# Altium footprint library Miscellaneous THD.PcbLib: 216 footprints (part 10 of 15)
Each footprint in its own frame and in the unit in brackets; x right, y up, seen from the top. Pads: shape width x height; smd on the part's side, far side on the other; paste and mask are expansions set on the pad; w line width, h text height; cw(c..) or ccw(c..) is an arc to the next point about the centre after c.
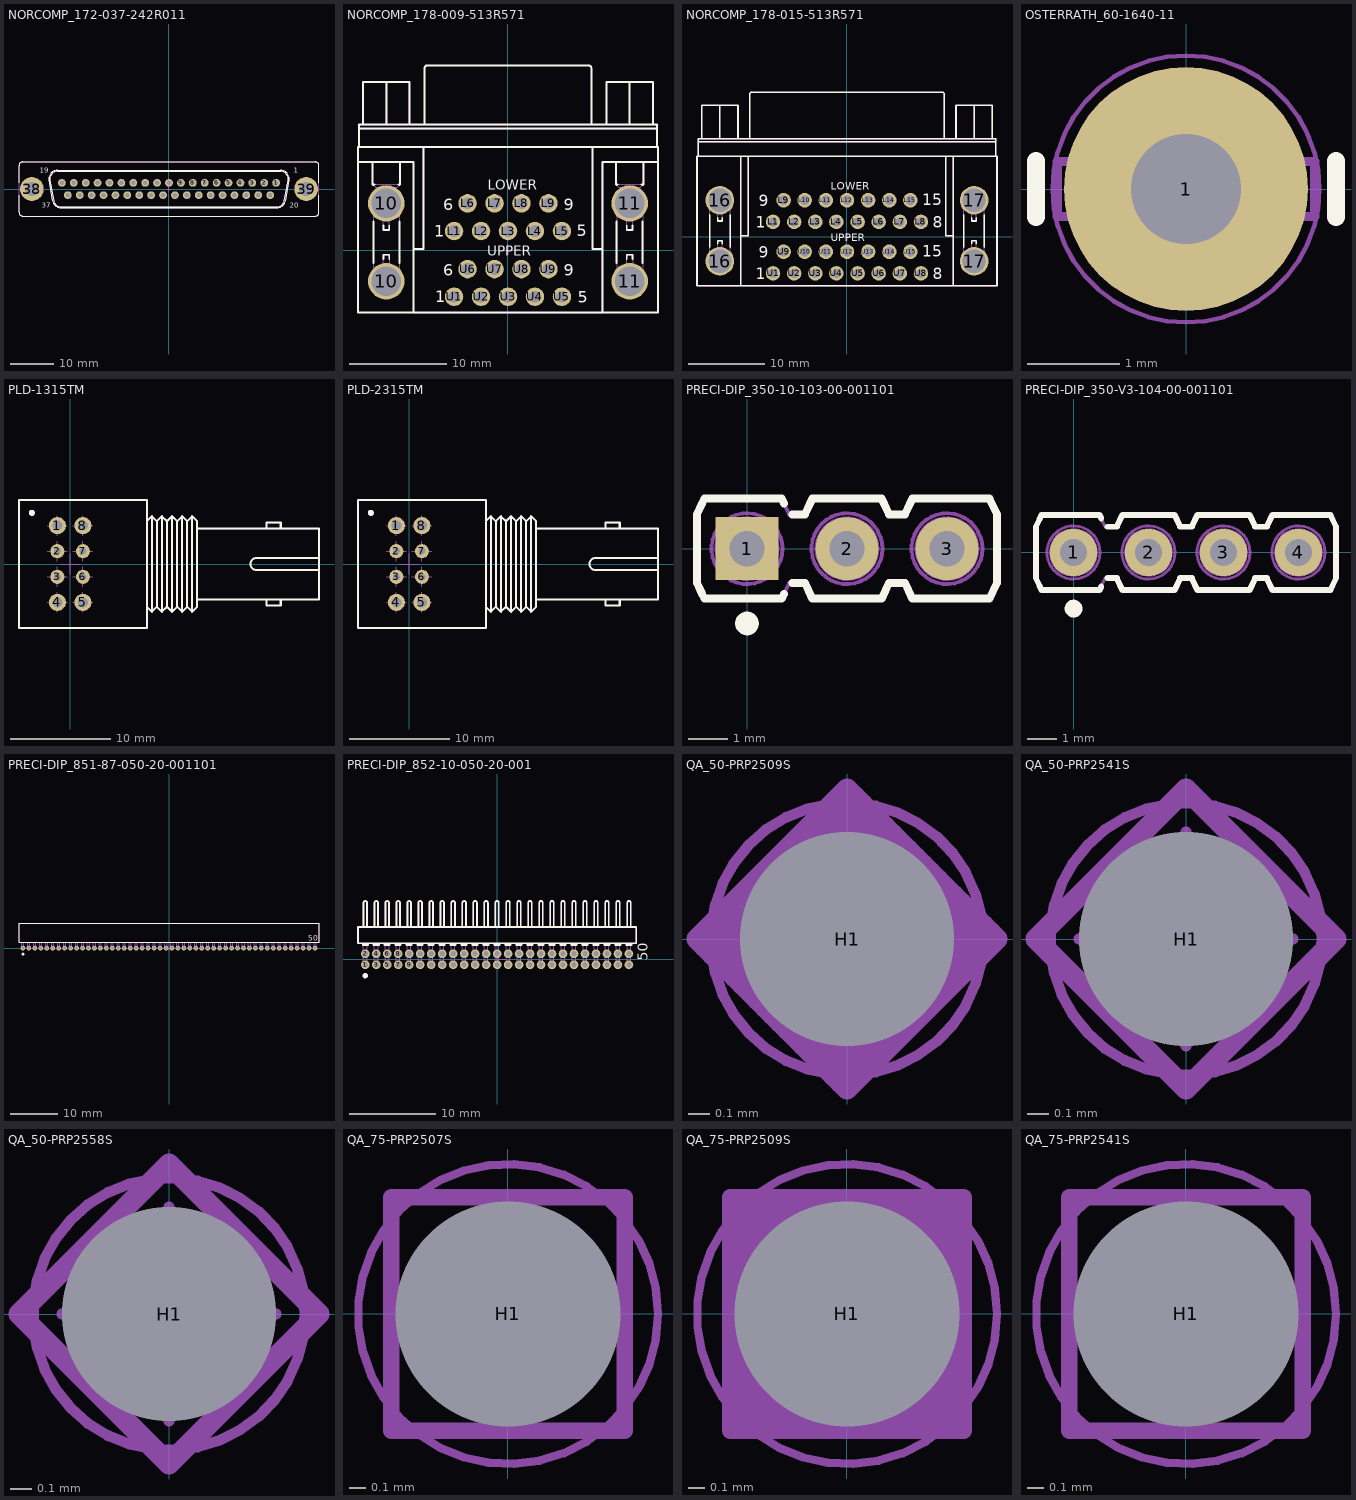
[diagram p9: the footprints below, top view; thin cyan lines are the x and y axes]

## NORCOMP_172-037-242R011 [mm] "Straight Wire Wrap D-Sub 37 Contacts Female Connector"
height 12.08
pads (39):
  round 1.8 hole 1.1: 1(24.842,1.422) 2(22.082,1.422) 3(19.322,1.422) 4(16.561,1.422) 5(13.801,1.422) 6(11.041,1.422) 7(8.281,1.422) 8(5.52,1.422) 9(2.76,1.422) 10(0,1.422) 11(-2.76,1.422) 12(-5.52,1.422) 13(-8.281,1.422) 14(-11.041,1.422) 15(-13.801,1.422) 16(-16.561,1.422) 17(-19.322,1.422) 18(-22.082,1.422) 19(-24.842,1.422) 20(23.458,-1.422) 21(20.697,-1.422) 22(17.937,-1.422) 23(15.177,-1.422) 24(12.417,-1.422) 25(9.657,-1.422) 26(6.896,-1.422) 27(4.136,-1.422) 28(1.376,-1.422) 29(-1.384,-1.422) 30(-4.145,-1.422) 31(-6.905,-1.422) 32(-9.665,-1.422) 33(-12.425,-1.422) 34(-15.185,-1.422) 35(-17.946,-1.422) 36(-20.706,-1.422) 37(-23.466,-1.422)
  round 5.5 hole 3.2: 38(-31.8,0) 39(31.801,0)
Top Overlay:
  lines w0.2: -34.785,-1.5 -34.785,-5.41 ccw(c-33.896,-5.41) -33.896,-6.299 33.897,-6.299 ccw(c33.897,-5.41) 34.786,-5.41 34.786,-1.5 ; -34.785,1.5 -34.785,5.41 cw(c-33.896,5.41) -33.896,6.299 33.897,6.299 cw(c33.897,5.41) 34.786,5.41 34.786,1.5 ; -27.858,2.035 cw(c-25.932,2.375) -25.932,4.331 25.933,4.331 cw(c25.933,2.375) 27.859,2.035 27.021,-2.715 cw(c25.095,-2.375) 25.095,-4.331 -25.094,-4.331 cw(c-25.094,-2.375) -27.02,-2.715 -27.858,2.035 ; -27.608,2.079 cw(c-25.932,2.375) -25.932,4.077 25.933,4.077 cw(c25.933,2.375) 27.609,2.079 26.77,-2.671 cw(c25.095,-2.375) 25.095,-4.077 -25.094,-4.077 cw(c-25.094,-2.375) -26.769,-2.671 -27.608,2.079
  text "20" at 28.031,-4.4 h1.2
  text "19" at -30.031,3.8 h1.2
  text "37" at -29.531,-4.4 h1.2
  text "1" at 28.881,3.8 h1.2
Mechanical 8:
  drawing of 160 lines, arcs and shapes, not listed
Mechanical 14:
  circle w0.1: c31.801,0 r2
  circle w0.1: c31.801,0 r1.524
  circle w0.1: c-31.8,0 r2
  circle w0.1: c-31.8,0 r1.524
  circle w0.1: c16.561,1.422 r0.61
  circle w0.1: c15.177,-1.422 r0.61
  circle w0.1: c13.801,1.422 r0.61
  circle w0.1: c11.041,1.422 r0.61
  circle w0.1: c12.417,-1.422 r0.61
  circle w0.1: c9.657,-1.422 r0.61
  circle w0.1: c8.281,1.422 r0.61
  circle w0.1: c6.896,-1.422 r0.61
  circle w0.1: c5.52,1.422 r0.61
  circle w0.1: c4.136,-1.422 r0.61
  circle w0.1: c2.76,1.422 r0.61
  circle w0.1: c0,1.422 r0.61
  circle w0.1: c1.376,-1.422 r0.61
  circle w0.1: c-1.384,-1.422 r0.61
  circle w0.1: c-2.76,1.422 r0.61
  circle w0.1: c-4.145,-1.422 r0.61
  circle w0.1: c-5.52,1.422 r0.61
  circle w0.1: c-6.905,-1.422 r0.61
  circle w0.1: c-8.281,1.422 r0.61
  circle w0.1: c-9.665,-1.422 r0.61
  circle w0.1: c-11.041,1.422 r0.61
  circle w0.1: c-12.425,-1.422 r0.61
  circle w0.1: c-13.801,1.422 r0.61
  circle w0.1: c-15.185,-1.422 r0.61
  circle w0.1: c-16.561,1.422 r0.61
  circle w0.1: c-24.842,1.422 r0.61
  circle w0.1: c-23.466,-1.422 r0.61
  circle w0.1: c-22.082,1.422 r0.61
  circle w0.1: c-20.706,-1.422 r0.61
  circle w0.1: c-19.322,1.422 r0.61
  circle w0.1: c-17.946,-1.422 r0.61
  circle w0.1: c17.937,-1.422 r0.61
  circle w0.1: c20.697,-1.422 r0.61
  circle w0.1: c19.322,1.422 r0.61
  circle w0.1: c22.082,1.422 r0.61
  circle w0.1: c23.458,-1.422 r0.61
  circle w0.1: c24.842,1.422 r0.61
  lines w0.1: -34.785,-5.41 ccw(c-33.896,-5.41) -33.896,-6.299 33.897,-6.299 ccw(c33.897,-5.41) 34.786,-5.41 34.786,5.41 ccw(c33.897,5.41) 33.897,6.299 -33.896,6.299 ccw(c-33.896,5.41) -34.785,5.41 -34.785,-5.41 ; -27.858,2.035 cw(c-25.932,2.375) -25.932,4.331 25.933,4.331 cw(c25.933,2.375) 27.859,2.035 27.021,-2.715 cw(c25.095,-2.375) 25.095,-4.331 -25.094,-4.331 cw(c-25.094,-2.375) -27.02,-2.715 -27.858,2.035 ; -27.608,2.079 cw(c-25.932,2.375) -25.932,4.077 25.933,4.077 cw(c25.933,2.375) 27.609,2.079 26.77,-2.671 cw(c25.095,-2.375) 25.095,-4.077 -25.094,-4.077 cw(c-25.094,-2.375) -26.769,-2.671 -27.608,2.079
  text "1" at 28.881,3.8 h1.2
  text "37" at -29.531,-4.4 h1.2
  text "19" at -30.031,3.8 h1.2
  text "20" at 28.031,-4.4 h1.2
3D body "NORCOMP_172-037-242R011.stp": height 11.93, standoff -12.7, extent -34.785,-6.299 34.786,6.299

## NORCOMP_178-009-513R571 [mm] "Dual Stacked  Right Angled D-SUB 9 Pins Female Connector, With Threaded Insert UNC 4-40, And Fork Board Lock"
height 31.75
pads (22):
  round 3.75 hole 3.05: 10(-12.495,-3.205) 10(-12.495,4.795) 11(12.495,-3.205) 11(12.495,4.795)
  round 1.9 hole 1.2: L1(-5.54,1.955) L2(-2.77,1.955) L3(0,1.955) L4(2.77,1.955) L5(5.54,1.955) L6(-4.155,4.795) L7(-1.385,4.795) L8(1.385,4.795) L9(4.155,4.795) U1(-5.54,-4.795) U2(-2.77,-4.795) U3(0,-4.795) U4(2.77,-4.795) U5(5.54,-4.795) U6(-4.155,-1.955) U7(-1.385,-1.955) U8(1.385,-1.955) U9(4.155,-1.955)
Top Overlay:
  lines w0.2: -15.405,9.039 -9.69,9.039 -9.69,-6.43 9.69,-6.43 9.69,9.039 15.405,9.039 ; -14.872,12.874 -14.872,17.274 -10.122,17.274 -10.122,12.874 ; -13.897,9.039 -13.897,6.739 ; -13.828,-1.331 -13.828,2.919 ; -13.828,6.669 -13.897,6.739 ; -13.725,6.739 -13.897,6.739 ; -12.797,-0.924 -12.797,-0.483 -12.197,-0.483 -12.197,-0.925 ; -12.797,2.513 -12.797,2.075 -12.197,2.075 -12.197,2.514 ; -12.497,12.875 -12.497,17.274 ; -11.265,6.739 -11.097,6.739 ; -11.164,6.671 -11.097,6.739 ; -11.158,-1.333 -11.158,2.924 ; -11.097,9.039 -11.097,6.739 ; -9.69,-6.405 -15.405,-6.405 -15.405,10.563 15.405,10.563 15.405,-6.405 9.69,-6.405 ; -9.69,0.123 -8.699,0.123 -8.699,10.563 ; -8.569,12.874 -8.569,18.67 cw(c-8.269,18.67) -8.269,18.97 8.269,18.97 cw(c8.269,18.67) 8.569,18.67 8.569,12.874 ; 8.7,10.563 8.7,0.123 9.69,0.123 ; 10.122,12.874 10.122,17.274 14.872,17.274 14.872,12.874 ; 11.097,9.039 11.097,6.739 ; 11.162,-1.331 11.162,2.919 ; 11.164,6.671 11.097,6.739 ; 11.265,6.739 11.097,6.739 ; 12.193,-0.924 12.193,-0.483 12.793,-0.483 12.793,-0.925 ; 12.193,2.513 12.193,2.075 12.793,2.075 12.793,2.514 ; 12.497,12.875 12.497,17.274 ; 13.725,6.739 13.897,6.739 ; 13.828,6.669 13.897,6.739 ; 13.832,-1.333 13.832,2.924 ; 13.897,9.039 13.897,6.739 ; -15.291,10.588 -15.291,12.468 15.291,12.468 15.291,10.588 -15.291,10.588 ; -15.291,12.493 -15.291,12.874 15.291,12.874 15.291,12.493 -15.291,12.493
  text "5" at 7.141,-5.407 h1.2
  text "9" at 5.726,-2.642 h1.2
  text "6" at -6.661,-2.642 h1.2
  text "1" at -7.474,-5.382 h1.2
  text "UPPER" at -2.125,-0.6 h1
  text "6" at -6.661,4.108 h1.2
  text "1" at -7.549,1.368 h1.2
  text "LOWER" at -2.1,6.18 h1
  text "5" at 7.041,1.393 h1.2
  text "9" at 5.726,4.108 h1.2
Mechanical 8:
  lines w0.1: -15.405,12.875 0,12.875 15.405,12.875 ; -12.995,-3.205 -12.495,-3.205 ; -12.995,4.795 -12.495,4.795 ; -12.495,-3.705 -12.495,-3.205 ; -12.495,-2.705 -12.495,-3.205 ; -12.495,4.295 -12.495,4.795 ; -12.495,5.295 -12.495,4.795 ; -11.995,-3.205 -12.495,-3.205 ; -11.995,4.795 -12.495,4.795 ; -6.04,-4.795 -5.54,-4.795 ; -6.04,1.955 -5.54,1.955 ; -5.54,-5.295 -5.54,-4.795 ; -5.54,-4.295 -5.54,-4.795 ; -5.54,1.455 -5.54,1.955 ; -5.54,2.455 -5.54,1.955 ; -5.04,-4.795 -5.54,-4.795 ; -5.04,1.955 -5.54,1.955 ; -4.655,-1.955 -4.155,-1.955 ; -4.655,4.795 -4.155,4.795 ; -4.155,-2.455 -4.155,-1.955 ; -4.155,-1.455 -4.155,-1.955 ; -4.155,4.295 -4.155,4.795 ; -4.155,5.295 -4.155,4.795 ; -3.655,-1.955 -4.155,-1.955 ; -3.655,4.795 -4.155,4.795 ; -3.27,-4.795 -2.77,-4.795 ; -3.27,1.955 -2.77,1.955 ; -2.77,-5.295 -2.77,-4.795 ; -2.77,-4.295 -2.77,-4.795 ; -2.77,1.455 -2.77,1.955 ; -2.77,2.455 -2.77,1.955 ; -2.27,-4.795 -2.77,-4.795 ; -2.27,1.955 -2.77,1.955 ; -1.885,-1.955 -1.385,-1.955 ; -1.885,4.795 -1.385,4.795 ; -1.385,-2.455 -1.385,-1.955 ; -1.385,-1.455 -1.385,-1.955 ; -1.385,4.295 -1.385,4.795 ; -1.385,5.295 -1.385,4.795 ; -0.885,-1.955 -1.385,-1.955 ; -0.885,4.795 -1.385,4.795 ; -0.5,-4.795 0,-4.795 ; -0.5,0 0,0 ; -0.5,1.955 0,1.955 ; 0,-5.295 0,-4.795 ; 0,-4.295 0,-4.795 ; 0,-0.5 0,0 ; 0,0.5 0,0 ; 0,1.455 0,1.955 ; 0,2.455 0,1.955 ; 0.5,-4.795 0,-4.795 ; 0.5,0 0,0 ; 0.5,1.955 0,1.955 ; 0.885,-1.955 1.385,-1.955 ; 0.885,4.795 1.385,4.795 ; 1.385,-2.455 1.385,-1.955 ; 1.385,-1.455 1.385,-1.955 ; 1.385,4.295 1.385,4.795 ; 1.385,5.295 1.385,4.795 ; 1.885,-1.955 1.385,-1.955 ; 1.885,4.795 1.385,4.795 ; 2.27,-4.795 2.77,-4.795 ; 2.27,1.955 2.77,1.955 ; 2.77,-5.295 2.77,-4.795 ; 2.77,-4.295 2.77,-4.795 ; 2.77,1.455 2.77,1.955 ; 2.77,2.455 2.77,1.955 ; 3.27,-4.795 2.77,-4.795 ; 3.27,1.955 2.77,1.955 ; 3.655,-1.955 4.155,-1.955 ; 3.655,4.795 4.155,4.795 ; 4.155,-2.455 4.155,-1.955 ; 4.155,-1.455 4.155,-1.955 ; 4.155,4.295 4.155,4.795 ; 4.155,5.295 4.155,4.795 ; 4.655,-1.955 4.155,-1.955 ; 4.655,4.795 4.155,4.795 ; 5.04,-4.795 5.54,-4.795 ; 5.04,1.955 5.54,1.955 ; 5.54,-5.295 5.54,-4.795 ; 5.54,-4.295 5.54,-4.795 ; 5.54,1.455 5.54,1.955 ; 5.54,2.455 5.54,1.955 ; 6.04,-4.795 5.54,-4.795 ; 6.04,1.955 5.54,1.955 ; 11.995,-3.205 12.495,-3.205 ; 11.995,4.795 12.495,4.795 ; 12.495,-3.705 12.495,-3.205 ; 12.495,-2.705 12.495,-3.205 ; 12.495,4.295 12.495,4.795 ; 12.495,5.295 12.495,4.795 ; 12.995,-3.205 12.495,-3.205 ; 12.995,4.795 12.495,4.795
Mechanical 14:
  lines w0.1: -15.405,9.039 -9.69,9.039 -9.69,-6.43 9.69,-6.43 9.69,9.039 15.405,9.039 ; -14.872,12.874 -14.872,17.274 -10.122,17.274 -10.122,12.874 ; -13.989,5.087 -12.797,5.087 -12.797,2.075 -12.197,2.075 -12.197,5.087 -10.997,5.087 ; -13.988,-3.503 -12.797,-3.503 -12.797,-0.483 -12.197,-0.483 -12.196,-3.503 -10.999,-3.503 ; -13.987,-2.903 -13.828,-2.903 ; -13.949,4.345 -13.828,4.345 ; -13.897,9.039 -13.897,6.739 ; -13.832,5.087 -13.828,-3.503 ; -13.828,-2.469 ccw(c-12.493,-3.204) -11.158,-2.469 ; -13.828,4.062 cw(c-12.493,4.797) -11.158,4.062 ; -12.497,12.875 -12.497,17.274 ; -11.162,4.487 -11.001,4.487 ; -11.162,5.087 -11.158,-3.503 ; -11.158,-2.903 -10.999,-2.903 ; -11.097,9.039 -11.097,6.739 ; -9.69,-6.405 -15.405,-6.405 -15.405,10.563 15.405,10.563 15.405,-6.405 9.69,-6.405 ; -9.69,0.123 -8.699,0.123 -8.699,10.563 ; -8.569,12.874 -8.569,18.67 cw(c-8.269,18.67) -8.269,18.97 8.269,18.97 cw(c8.269,18.67) 8.569,18.67 8.569,12.874 ; 8.7,10.563 8.7,0.123 9.69,0.123 ; 10.122,12.874 10.122,17.274 14.872,17.274 14.872,12.874 ; 11.001,5.087 12.193,5.087 12.193,2.075 12.793,2.075 12.793,5.087 13.993,5.087 ; 11.002,-3.503 12.193,-3.503 12.193,-0.483 12.793,-0.483 12.794,-3.503 13.991,-3.503 ; 11.003,-2.903 11.162,-2.903 ; 11.041,4.345 11.162,4.345 ; 11.097,9.039 11.097,6.739 ; 11.158,5.087 11.162,-3.503 ; 11.162,-2.469 ccw(c12.497,-3.204) 13.832,-2.469 ; 11.162,4.062 cw(c12.497,4.797) 13.832,4.062 ; 12.497,12.875 12.497,17.274 ; 13.828,4.487 13.989,4.487 ; 13.828,5.087 13.832,-3.503 ; 13.832,-2.903 13.991,-2.903 ; 13.897,9.039 13.897,6.739 ; -13.897,6.739 -13.597,6.439 -11.397,6.439 -11.097,6.739 ; -13.897,6.739 -11.097,6.739 ; 11.097,6.739 13.897,6.739 ; 11.097,6.739 11.397,6.439 13.597,6.439 13.897,6.739 ; -15.291,10.588 -15.291,12.468 15.291,12.468 15.291,10.588 -15.291,10.588 ; -15.291,12.493 -15.291,12.874 15.291,12.874 15.291,12.493 -15.291,12.493
  text "1" at -7.474,-5.382 h1.2
  text "6" at -6.661,-2.642 h1.2
  text "9" at 5.726,-2.642 h1.2
  text "5" at 7.141,-5.407 h1.2
  text "UPPER" at -2.125,-0.6 h1
  text "9" at 5.726,4.108 h1.2
  text "5" at 7.041,1.393 h1.2
  text "1" at -7.549,1.368 h1.2
  text "6" at -6.661,4.108 h1.2
  text "LOWER" at -2.1,6.18 h1
3D body "NORCOMP_178-009-513R571.stp": height 31.78, standoff -3.17, extent -15.405,-6.43 15.405,18.995

## NORCOMP_178-015-513R571 [mm] "Dual Stacked  Right Angled D-SUB 15 Pins Female Connector, With Threaded Insert UNC 4-40, And Fork Board Lock"
height 31.75
pads (34):
  round 3.75 hole 3.05: 16(-16.66,-3.205) 16(-16.66,4.795) 17(16.66,4.795) 17(16.66,-3.205)
  round 1.9 hole 1.2: L1(-9.695,1.955) L2(-6.925,1.955) L3(-4.155,1.955) L4(-1.385,1.955) L5(1.385,1.955) L6(4.155,1.955) L7(6.925,1.955) L8(9.695,1.955) L9(-8.31,4.795) L10(-5.54,4.795) L11(-2.77,4.795) L12(0,4.795) L13(2.77,4.795) L14(5.54,4.795) L15(8.31,4.795) U1(-9.695,-4.795) U2(-6.925,-4.795) U3(-4.155,-4.795) U4(-1.385,-4.795) U5(1.385,-4.795) U6(4.155,-4.795) U7(6.925,-4.795) U8(9.695,-4.795) U9(-8.31,-1.955) U10(-5.54,-1.955) U11(-2.77,-1.955) U12(0,-1.955) U13(2.77,-1.955) U14(5.54,-1.955) U15(8.31,-1.955)
Top Overlay:
  lines w0.2: -19.037,12.875 -19.037,17.274 -14.287,17.274 -14.287,12.874 ; -17.997,-1.334 -17.997,2.924 ; -16.962,-0.925 -16.962,-0.483 -16.362,-0.483 -16.362,-0.924 ; -16.962,2.515 -16.962,2.075 -16.362,2.075 -16.362,2.514 ; -16.662,12.875 -16.662,17.274 ; -15.327,-1.33 -15.327,2.92 ; -13.945,-6.405 -19.66,-6.405 -19.66,10.563 19.66,10.563 19.66,-6.405 13.945,-6.405 ; -13.945,0.123 -12.954,0.123 -12.954,10.588 ; -13.945,10.588 -13.945,-6.43 13.945,-6.43 13.945,10.563 ; -12.747,12.874 -12.747,18.67 cw(c-12.447,18.67) -12.447,18.97 12.447,18.97 cw(c12.447,18.67) 12.747,18.67 12.747,12.875 ; 12.954,10.588 12.954,0.123 13.945,0.123 ; 14.287,12.875 14.287,17.274 19.037,17.274 19.037,12.874 ; 15.323,-1.334 15.323,2.924 ; 16.358,-0.925 16.358,-0.483 16.958,-0.483 16.958,-0.924 ; 16.358,2.515 16.358,2.075 16.958,2.075 16.958,2.514 ; 16.662,12.874 16.662,17.274 ; 17.993,-1.33 17.993,2.92 ; -19.494,10.588 19.495,10.588 19.495,12.468 -19.494,12.468 -19.494,10.588 ; -19.494,12.493 19.495,12.493 19.495,12.875 -19.494,12.874 -19.494,12.493
  text "9" at -11.566,4.033 h1.5
  text "1" at -11.954,1.193 h1.5
  text "8" at 11.271,1.218 h1.5
  text "15" at 9.881,4.108 h1.5
  text "LOWER" at -2.1,6.18 h1
  text "UPPER" at -2.1,-0.57 h1
  text "9" at -11.566,-2.717 h1.5
  text "1" at -11.954,-5.557 h1.5
  text "8" at 11.271,-5.532 h1.5
  text "15" at 9.881,-2.642 h1.5
Mechanical 8:
  lines w0.1: -19.66,12.875 0,12.875 19.66,12.875 ; -17.16,-3.205 -16.66,-3.205 ; -17.16,4.795 -16.66,4.795 ; -16.66,-3.705 -16.66,-3.205 ; -16.66,-2.705 -16.66,-3.205 ; -16.66,4.295 -16.66,4.795 ; -16.66,5.295 -16.66,4.795 ; -16.16,-3.205 -16.66,-3.205 ; -16.16,4.795 -16.66,4.795 ; -10.195,-4.795 -9.695,-4.795 ; -10.195,1.955 -9.695,1.955 ; -9.695,-5.295 -9.695,-4.795 ; -9.695,-4.295 -9.695,-4.795 ; -9.695,1.455 -9.695,1.955 ; -9.695,2.455 -9.695,1.955 ; -9.195,-4.795 -9.695,-4.795 ; -9.195,1.955 -9.695,1.955 ; -8.81,-1.955 -8.31,-1.955 ; -8.81,4.795 -8.31,4.795 ; -8.31,-2.455 -8.31,-1.955 ; -8.31,-1.455 -8.31,-1.955 ; -8.31,4.295 -8.31,4.795 ; -8.31,5.295 -8.31,4.795 ; -7.81,-1.955 -8.31,-1.955 ; -7.81,4.795 -8.31,4.795 ; -7.425,-4.795 -6.925,-4.795 ; -7.425,1.955 -6.925,1.955 ; -6.925,-5.295 -6.925,-4.795 ; -6.925,-4.295 -6.925,-4.795 ; -6.925,1.455 -6.925,1.955 ; -6.925,2.455 -6.925,1.955 ; -6.425,-4.795 -6.925,-4.795 ; -6.425,1.955 -6.925,1.955 ; -6.04,-1.955 -5.54,-1.955 ; -6.04,4.795 -5.54,4.795 ; -5.54,-2.455 -5.54,-1.955 ; -5.54,-1.455 -5.54,-1.955 ; -5.54,4.295 -5.54,4.795 ; -5.54,5.295 -5.54,4.795 ; -5.04,-1.955 -5.54,-1.955 ; -5.04,4.795 -5.54,4.795 ; -4.655,-4.795 -4.155,-4.795 ; -4.655,1.955 -4.155,1.955 ; -4.155,-5.295 -4.155,-4.795 ; -4.155,-4.295 -4.155,-4.795 ; -4.155,1.455 -4.155,1.955 ; -4.155,2.455 -4.155,1.955 ; -3.655,-4.795 -4.155,-4.795 ; -3.655,1.955 -4.155,1.955 ; -3.27,-1.955 -2.77,-1.955 ; -3.27,4.795 -2.77,4.795 ; -2.77,-2.455 -2.77,-1.955 ; -2.77,-1.455 -2.77,-1.955 ; -2.77,4.295 -2.77,4.795 ; -2.77,5.295 -2.77,4.795 ; -2.27,-1.955 -2.77,-1.955 ; -2.27,4.795 -2.77,4.795 ; -1.885,-4.795 -1.385,-4.795 ; -1.885,1.955 -1.385,1.955 ; -1.385,-5.295 -1.385,-4.795 ; -1.385,-4.295 -1.385,-4.795 ; -1.385,1.455 -1.385,1.955 ; -1.385,2.455 -1.385,1.955 ; -0.885,-4.795 -1.385,-4.795 ; -0.885,1.955 -1.385,1.955 ; -0.5,-1.955 0,-1.955 ; -0.5,0 0,0 ; -0.5,4.795 0,4.795 ; 0,-2.455 0,-1.955 ; 0,-1.455 0,-1.955 ; 0,-0.5 0,0 ; 0,0.5 0,0 ; 0,4.295 0,4.795 ; 0,5.295 0,4.795 ; 0.5,-1.955 0,-1.955 ; 0.5,0 0,0 ; 0.5,4.795 0,4.795 ; 0.885,-4.795 1.385,-4.795 ; 0.885,1.955 1.385,1.955 ; 1.385,-5.295 1.385,-4.795 ; 1.385,-4.295 1.385,-4.795 ; 1.385,1.455 1.385,1.955 ; 1.385,2.455 1.385,1.955 ; 1.885,-4.795 1.385,-4.795 ; 1.885,1.955 1.385,1.955 ; 2.27,-1.955 2.77,-1.955 ; 2.27,4.795 2.77,4.795 ; 2.77,-2.455 2.77,-1.955 ; 2.77,-1.455 2.77,-1.955 ; 2.77,4.295 2.77,4.795 ; 2.77,5.295 2.77,4.795 ; 3.27,-1.955 2.77,-1.955 ; 3.27,4.795 2.77,4.795 ; 3.655,-4.795 4.155,-4.795 ; 3.655,1.955 4.155,1.955 ; 4.155,-5.295 4.155,-4.795 ; 4.155,-4.295 4.155,-4.795 ; 4.155,1.455 4.155,1.955 ; 4.155,2.455 4.155,1.955 ; 4.655,-4.795 4.155,-4.795 ; 4.655,1.955 4.155,1.955 ; 5.04,-1.955 5.54,-1.955 ; 5.04,4.795 5.54,4.795 ; 5.54,-2.455 5.54,-1.955 ; 5.54,-1.455 5.54,-1.955 ; 5.54,4.295 5.54,4.795 ; 5.54,5.295 5.54,4.795 ; 6.04,-1.955 5.54,-1.955 ; 6.04,4.795 5.54,4.795 ; 6.425,-4.795 6.925,-4.795 ; 6.425,1.955 6.925,1.955 ; 6.925,-5.295 6.925,-4.795 ; 6.925,-4.295 6.925,-4.795 ; 6.925,1.455 6.925,1.955 ; 6.925,2.455 6.925,1.955 ; 7.425,-4.795 6.925,-4.795 ; 7.425,1.955 6.925,1.955 ; 7.81,-1.955 8.31,-1.955 ; 7.81,4.795 8.31,4.795 ; 8.31,-2.455 8.31,-1.955 ; 8.31,-1.455 8.31,-1.955 ; 8.31,4.295 8.31,4.795 ; 8.31,5.295 8.31,4.795 ; 8.81,-1.955 8.31,-1.955 ; 8.81,4.795 8.31,4.795 ; 9.195,-4.795 9.695,-4.795 ; 9.195,1.955 9.695,1.955 ; 9.695,-5.295 9.695,-4.795 ; 9.695,-4.295 9.695,-4.795 ; 9.695,1.455 9.695,1.955 ; 9.695,2.455 9.695,1.955 ; 10.195,-4.795 9.695,-4.795 ; 10.195,1.955 9.695,1.955 ; 16.16,-3.205 16.66,-3.205 ; 16.16,4.795 16.66,4.795 ; 16.66,-3.705 16.66,-3.205 ; 16.66,-2.705 16.66,-3.205 ; 16.66,4.295 16.66,4.795 ; 16.66,5.295 16.66,4.795 ; 17.16,-3.205 16.66,-3.205 ; 17.16,4.795 16.66,4.795
Mechanical 14:
  lines w0.1: -19.037,12.875 -19.037,17.274 -14.287,17.274 -14.287,12.874 ; -18.154,5.087 -16.962,5.087 -16.962,2.075 -16.362,2.075 -16.362,5.087 -15.166,5.087 ; -18.153,-3.502 -16.962,-3.495 -16.962,-0.483 -16.362,-0.483 -16.362,-3.495 -15.167,-3.502 ; -18.152,-2.903 -17.997,-2.903 -17.997,4.487 -18.151,4.487 ; -17.997,-2.477 ccw(c-16.66,-3.205) -15.327,-2.469 ; -17.997,4.067 cw(c-16.66,4.795) -15.327,4.059 ; -16.662,12.875 -16.662,17.274 ; -15.168,-2.903 -15.327,-2.903 -15.327,4.495 -15.168,4.492 ; -13.945,-6.405 -19.66,-6.405 -19.66,10.563 19.66,10.563 19.66,-6.405 13.945,-6.405 ; -13.945,0.123 -12.954,0.123 -12.954,10.588 ; -13.945,10.588 -13.945,-6.43 13.945,-6.43 13.945,10.563 ; -12.747,12.874 -12.747,18.67 cw(c-12.447,18.67) -12.447,18.97 12.447,18.97 cw(c12.447,18.67) 12.747,18.67 12.747,12.875 ; 12.954,10.588 12.954,0.123 13.945,0.123 ; 14.287,12.875 14.287,17.274 19.037,17.274 19.037,12.874 ; 15.167,-3.502 16.358,-3.495 16.358,-0.483 16.958,-0.483 16.958,-3.495 18.153,-3.502 ; 15.166,5.087 16.358,5.087 16.358,2.075 16.958,2.075 16.958,5.087 18.154,5.087 ; 15.168,-2.903 15.323,-2.903 15.323,4.487 15.169,4.487 ; 15.323,-2.477 ccw(c16.66,-3.205) 17.993,-2.469 ; 15.323,4.067 cw(c16.66,4.795) 17.993,4.059 ; 16.662,12.874 16.662,17.274 ; 18.152,-2.903 17.993,-2.903 17.993,4.495 18.152,4.492 ; -19.494,10.588 19.495,10.588 19.495,12.468 -19.494,12.468 -19.494,10.588 ; -19.494,12.493 19.495,12.493 19.495,12.875 -19.494,12.874 -19.494,12.493
  text "UPPER" at -2.1,-0.57 h1
  text "15" at 9.881,-2.642 h1.5
  text "8" at 11.271,-5.532 h1.5
  text "1" at -11.954,-5.557 h1.5
  text "9" at -11.566,-2.717 h1.5
  text "LOWER" at -2.1,6.18 h1
  text "15" at 9.881,4.108 h1.5
  text "8" at 11.271,1.218 h1.5
  text "1" at -11.954,1.193 h1.5
  text "9" at -11.566,4.033 h1.5
3D body "NORCOMP_178-015-513R571.stp": height 31.78, standoff -3.17, extent -19.659,-6.43 19.66,18.995

## OSTERRATH_60-1640-11 [mm] "Soldering Tag for Printed Circuit"
height 5.6
pads (1):
  round 2.65 hole 1.2: 1(0,0)
Top Overlay:
  lines w0.2: -1.63,-0.3 -1.63,0.3 ; 1.63,-0.3 1.63,0.3
Mechanical 14:
  lines w0.1: -0.9,-0.3 -0.9,0.3 ; 0.9,-0.3 0.9,0.3 ; -1.4,-0.3 -1.4,0.3 1.4,0.3 1.4,-0.3 -1.4,-0.3
Mechanical 15:
  circle w0.05: c0,0 r1.45
3D body "OSTERRATH-60-1640-11.stp": height 5.6, standoff -3, extent -1.4,-0.3 1.4,0.3

## PLD-1315TM [mm] "Fiber Optic Transmitter, Through Hole Mount"
height 10.2
pads (8):
  round 1.7 hole 1: 1(-1.27,3.81) 4(-1.27,-3.81) 5(1.27,-3.81) 8(1.27,3.81)
  round 1.4 hole 0.7: 2(-1.27,1.27) 3(-1.27,-1.27) 6(1.27,-1.27) 7(1.27,1.27)
Top Overlay:
  circle w0.3: c-3.81,5.08 r0.15
  lines w0.2: 7.62,-4.25 8.12,-4.75 ; 7.62,4.25 8.12,4.75 ; 12.62,-3.525 24.72,-3.525 ; 12.62,3.525 24.72,3.525 ; 19.52,-3.525 19.52,-4.1 20.92,-4.1 20.92,-3.525 ; 19.52,3.525 19.52,4.1 20.92,4.1 20.92,3.525 ; 24.72,-0.6 18.52,-0.6 cw(c18.52,0) 18.52,0.6 24.72,0.6 ; 8.12,-4.75 8.12,4.75 ; 8.12,-4.75 8.62,-4.25 ; 8.12,4.75 8.62,4.25 ; 8.62,-4.25 8.62,4.25 ; 8.62,-4.25 9.12,-4.75 ; 8.62,4.25 9.12,4.75 ; 9.12,-4.75 9.12,4.75 ; 9.12,-4.75 9.62,-4.25 ; 9.12,4.75 9.62,4.25 ; 9.62,-4.25 9.62,4.25 ; 9.62,-4.25 10.12,-4.75 ; 9.62,4.25 10.12,4.75 ; 10.12,-4.75 10.12,4.75 ; 10.12,-4.75 10.62,-4.25 ; 10.12,4.75 10.62,4.25 ; 10.62,-4.25 10.62,4.25 ; 10.62,-4.25 11.12,-4.75 ; 10.62,4.25 11.12,4.75 ; 11.12,-4.75 11.12,4.75 ; 11.12,-4.75 11.62,-4.25 ; 11.12,4.75 11.62,4.25 ; 11.62,-4.25 11.62,4.25 ; 11.62,-4.25 12.12,-4.75 ; 11.62,4.25 12.12,4.75 ; 12.12,-4.75 12.12,4.75 ; 12.12,-4.75 12.62,-4.25 12.62,4.25 12.12,4.75 ; 24.72,-3.525 24.72,3.525 ; 24.72,-3.525 24.72,3.525 ; -5.08,-6.35 7.62,-6.35 7.62,6.35 -5.08,6.35 -5.08,-6.35
Mechanical 8:
  lines w0.1: -2.27,-3.81 -1.27,-3.81 ; -2.27,-1.27 -1.27,-1.27 ; -2.27,1.27 -1.27,1.27 ; -2.27,3.81 -1.27,3.81 ; -1.27,-4.81 -1.27,-3.81 ; -1.27,-2.81 -1.27,-3.81 ; -1.27,-2.27 -1.27,-1.27 ; -1.27,-0.27 -1.27,-1.27 ; -1.27,0.27 -1.27,1.27 ; -1.27,2.27 -1.27,1.27 ; -1.27,2.81 -1.27,3.81 ; -1.27,4.81 -1.27,3.81 ; -1,0 0,0 ; -0.27,-3.81 -1.27,-3.81 ; -0.27,-1.27 -1.27,-1.27 ; -0.27,1.27 -1.27,1.27 ; -0.27,3.81 -1.27,3.81 ; 0,-1 0,0 ; 0,1 0,0 ; 0.27,-3.81 1.27,-3.81 ; 0.27,-1.27 1.27,-1.27 ; 0.27,1.27 1.27,1.27 ; 0.27,3.81 1.27,3.81 ; 1,0 0,0 ; 1.27,-4.81 1.27,-3.81 ; 1.27,-2.81 1.27,-3.81 ; 1.27,-2.27 1.27,-1.27 ; 1.27,-0.27 1.27,-1.27 ; 1.27,0.27 1.27,1.27 ; 1.27,2.27 1.27,1.27 ; 1.27,2.81 1.27,3.81 ; 1.27,4.81 1.27,3.81 ; 2.27,-3.81 1.27,-3.81 ; 2.27,-1.27 1.27,-1.27 ; 2.27,1.27 1.27,1.27 ; 2.27,3.81 1.27,3.81
Mechanical 14:
  circle w0.3: c-3.81,5.08 r0.15
  lines w0.1: 7.62,-4.25 8.12,-4.75 ; 7.62,4.25 8.12,4.75 ; 12.62,-3.525 24.72,-3.525 24.72,3.525 12.62,3.525 ; 19.52,-3.525 19.52,-4.1 20.92,-4.1 20.92,-3.525 ; 19.52,3.525 19.52,4.1 20.92,4.1 20.92,3.525 ; 24.72,-0.6 18.52,-0.6 cw(c18.52,0) 18.52,0.6 24.72,0.6 ; 8.12,-4.75 8.12,4.75 ; 8.12,-4.75 8.62,-4.25 ; 8.12,4.75 8.62,4.25 ; 8.62,-4.25 8.62,4.25 ; 8.62,-4.25 9.12,-4.75 ; 8.62,4.25 9.12,4.75 ; 9.12,-4.75 9.12,4.75 ; 9.12,-4.75 9.62,-4.25 ; 9.12,4.75 9.62,4.25 ; 9.62,-4.25 9.62,4.25 ; 9.62,-4.25 10.12,-4.75 ; 9.62,4.25 10.12,4.75 ; 10.12,-4.75 10.12,4.75 ; 10.12,-4.75 10.62,-4.25 ; 10.12,4.75 10.62,4.25 ; 10.62,-4.25 10.62,4.25 ; 10.62,-4.25 11.12,-4.75 ; 10.62,4.25 11.12,4.75 ; 11.12,-4.75 11.12,4.75 ; 11.12,-4.75 11.62,-4.25 ; 11.12,4.75 11.62,4.25 ; 11.62,-4.25 11.62,4.25 ; 11.62,-4.25 12.12,-4.75 ; 11.62,4.25 12.12,4.75 ; 12.12,-4.75 12.12,4.75 ; 12.12,-4.75 12.62,-4.25 12.62,4.25 12.12,4.75 ; -5.08,-6.15 ccw(c-4.88,-6.15) -4.88,-6.35 7.42,-6.35 ccw(c7.42,-6.15) 7.62,-6.15 7.62,6.15 ccw(c7.42,6.15) 7.42,6.35 -4.88,6.35 ccw(c-4.88,6.15) -5.08,6.15 -5.08,-6.15
3D body "PLD-1315TM.stp": height 10.2, standoff -3.6, extent -5.08,-6.35 24.72,6.35

## PLD-2315TM [mm] "Fiber Optic Receiver, Through Hole Mount"
height 10.2
pads (8):
  round 1.7 hole 1: 1(-1.27,3.81) 4(-1.27,-3.81) 5(1.27,-3.81) 8(1.27,3.81)
  round 1.4 hole 0.7: 2(-1.27,1.27) 3(-1.27,-1.27) 6(1.27,-1.27) 7(1.27,1.27)
Top Overlay:
  circle w0.3: c-3.81,5.08 r0.15
  lines w0.2: 7.62,-4.25 8.12,-4.75 ; 7.62,4.25 8.12,4.75 ; 12.62,-3.525 24.72,-3.525 ; 12.62,3.525 24.72,3.525 ; 19.52,-3.525 19.52,-4.1 20.92,-4.1 20.92,-3.525 ; 19.52,3.525 19.52,4.1 20.92,4.1 20.92,3.525 ; 24.72,-0.6 18.52,-0.6 cw(c18.52,0) 18.52,0.6 24.72,0.6 ; 8.12,-4.75 8.12,4.75 ; 8.12,-4.75 8.62,-4.25 ; 8.12,4.75 8.62,4.25 ; 8.62,-4.25 8.62,4.25 ; 8.62,-4.25 9.12,-4.75 ; 8.62,4.25 9.12,4.75 ; 9.12,-4.75 9.12,4.75 ; 9.12,-4.75 9.62,-4.25 ; 9.12,4.75 9.62,4.25 ; 9.62,-4.25 9.62,4.25 ; 9.62,-4.25 10.12,-4.75 ; 9.62,4.25 10.12,4.75 ; 10.12,-4.75 10.12,4.75 ; 10.12,-4.75 10.62,-4.25 ; 10.12,4.75 10.62,4.25 ; 10.62,-4.25 10.62,4.25 ; 10.62,-4.25 11.12,-4.75 ; 10.62,4.25 11.12,4.75 ; 11.12,-4.75 11.12,4.75 ; 11.12,-4.75 11.62,-4.25 ; 11.12,4.75 11.62,4.25 ; 11.62,-4.25 11.62,4.25 ; 11.62,-4.25 12.12,-4.75 ; 11.62,4.25 12.12,4.75 ; 12.12,-4.75 12.12,4.75 ; 12.12,-4.75 12.62,-4.25 12.62,4.25 12.12,4.75 ; 24.72,-3.525 24.72,3.525 ; 24.72,-3.525 24.72,3.525 ; -5.08,-6.35 7.62,-6.35 7.62,6.35 -5.08,6.35 -5.08,-6.35
Mechanical 8:
  lines w0.1: -2.27,-3.81 -1.27,-3.81 ; -2.27,-1.27 -1.27,-1.27 ; -2.27,1.27 -1.27,1.27 ; -2.27,3.81 -1.27,3.81 ; -1.27,-4.81 -1.27,-3.81 ; -1.27,-2.81 -1.27,-3.81 ; -1.27,-2.27 -1.27,-1.27 ; -1.27,-0.27 -1.27,-1.27 ; -1.27,0.27 -1.27,1.27 ; -1.27,2.27 -1.27,1.27 ; -1.27,2.81 -1.27,3.81 ; -1.27,4.81 -1.27,3.81 ; -1,0 0,0 ; -0.27,-3.81 -1.27,-3.81 ; -0.27,-1.27 -1.27,-1.27 ; -0.27,1.27 -1.27,1.27 ; -0.27,3.81 -1.27,3.81 ; 0,-1 0,0 ; 0,1 0,0 ; 0.27,-3.81 1.27,-3.81 ; 0.27,-1.27 1.27,-1.27 ; 0.27,1.27 1.27,1.27 ; 0.27,3.81 1.27,3.81 ; 1,0 0,0 ; 1.27,-4.81 1.27,-3.81 ; 1.27,-2.81 1.27,-3.81 ; 1.27,-2.27 1.27,-1.27 ; 1.27,-0.27 1.27,-1.27 ; 1.27,0.27 1.27,1.27 ; 1.27,2.27 1.27,1.27 ; 1.27,2.81 1.27,3.81 ; 1.27,4.81 1.27,3.81 ; 2.27,-3.81 1.27,-3.81 ; 2.27,-1.27 1.27,-1.27 ; 2.27,1.27 1.27,1.27 ; 2.27,3.81 1.27,3.81
Mechanical 14:
  circle w0.3: c-3.81,5.08 r0.15
  lines w0.1: 7.62,-4.25 8.12,-4.75 ; 7.62,4.25 8.12,4.75 ; 12.62,-3.525 24.72,-3.525 24.72,3.525 12.62,3.525 ; 19.52,-3.525 19.52,-4.1 20.92,-4.1 20.92,-3.525 ; 19.52,3.525 19.52,4.1 20.92,4.1 20.92,3.525 ; 24.72,-0.6 18.52,-0.6 cw(c18.52,0) 18.52,0.6 24.72,0.6 ; 8.12,-4.75 8.12,4.75 ; 8.12,-4.75 8.62,-4.25 ; 8.12,4.75 8.62,4.25 ; 8.62,-4.25 8.62,4.25 ; 8.62,-4.25 9.12,-4.75 ; 8.62,4.25 9.12,4.75 ; 9.12,-4.75 9.12,4.75 ; 9.12,-4.75 9.62,-4.25 ; 9.12,4.75 9.62,4.25 ; 9.62,-4.25 9.62,4.25 ; 9.62,-4.25 10.12,-4.75 ; 9.62,4.25 10.12,4.75 ; 10.12,-4.75 10.12,4.75 ; 10.12,-4.75 10.62,-4.25 ; 10.12,4.75 10.62,4.25 ; 10.62,-4.25 10.62,4.25 ; 10.62,-4.25 11.12,-4.75 ; 10.62,4.25 11.12,4.75 ; 11.12,-4.75 11.12,4.75 ; 11.12,-4.75 11.62,-4.25 ; 11.12,4.75 11.62,4.25 ; 11.62,-4.25 11.62,4.25 ; 11.62,-4.25 12.12,-4.75 ; 11.62,4.25 12.12,4.75 ; 12.12,-4.75 12.12,4.75 ; 12.12,-4.75 12.62,-4.25 12.62,4.25 12.12,4.75 ; -5.08,-6.15 ccw(c-4.88,-6.15) -4.88,-6.35 7.42,-6.35 ccw(c7.42,-6.15) 7.62,-6.15 7.62,6.15 ccw(c7.42,6.15) 7.42,6.35 -4.88,6.35 ccw(c-4.88,6.15) -5.08,6.15 -5.08,-6.15
3D body "PLD-2315TM.stp": height 10.2, standoff -3.6, extent -5.08,-6.35 24.72,6.35

## PRECI-DIP_350-10-103-00-001101 [mm] "Pitch 2.54mm, Single Row, Straight 3 Contacts PCB Header"
height 7.96
pads (3):
  rect 1.6x1.6 hole 0.9: 1(0,0)
  round 1.6 hole 0.9: 2(2.54,0) 3(5.08,0)
Top Overlay:
  circle w0.3: c0,-1.9 r0.15
  lines w0.2: -1.15,-1.127 -1.27,-0.87 -1.27,0.87 -1.15,1.127 ; -1.139,-1.15 -1.083,-1.27 0.883,-1.27 0.939,-1.15 ; -1.139,1.15 -1.083,1.27 0.883,1.27 0.939,1.15 ; 1.15,-0.87 1.47,-0.87 1.657,-1.27 3.423,-1.27 3.61,-0.87 4.01,-0.87 4.197,-1.27 6.163,-1.27 6.35,-0.87 6.35,0.87 6.163,1.27 4.197,1.27 4.01,0.87 3.61,0.87 3.423,1.27 1.657,1.27 1.47,0.87 1.15,0.87
Mechanical 8:
  circle w0.05: c0,0 r0.45
  circle w0.05: c0,0 r0.8
  circle w0.05: c2.54,0 r0.45
  circle w0.05: c2.54,0 r0.8
  circle w0.05: c5.08,0 r0.45
  circle w0.05: c5.08,0 r0.8
  lines w0.05: -0.5,0 0,0 ; 0,-0.5 0,0 ; 0,0.5 0,0 ; 0.5,0 0,0 ; 2.04,0 2.54,0 ; 2.54,-0.5 2.54,0 ; 2.54,0.5 2.54,0 ; 3.04,0 2.54,0 ; 4.58,0 5.08,0 ; 5.08,-0.5 5.08,0 ; 5.08,0.5 5.08,0 ; 5.58,0 5.08,0
Mechanical 14:
  circle w0.1: c0,0 r0.9
  circle w0.1: c0,0 r0.7
  circle w0.1: c0,0 r0.4
  circle w0.1: c0,0 r0.25
  circle w0.1: c2.54,0 r0.9
  circle w0.1: c2.54,0 r0.7
  circle w0.1: c2.54,0 r0.4
  circle w0.1: c2.54,0 r0.25
  circle w0.1: c5.08,0 r0.9
  circle w0.1: c5.08,0 r0.7
  circle w0.1: c5.08,0 r0.4
  circle w0.1: c5.08,0 r0.25
  lines w0.1: -1.27,-0.87 -1.083,-1.27 0.883,-1.27 1.07,-0.87 1.47,-0.87 1.657,-1.27 3.423,-1.27 3.61,-0.87 4.01,-0.87 4.197,-1.27 6.163,-1.27 6.35,-0.87 6.35,0.87 6.163,1.27 4.197,1.27 4.01,0.87 3.61,0.87 3.423,1.27 1.657,1.27 1.47,0.87 1.07,0.87 0.883,1.27 -1.083,1.27 -1.27,0.87 -1.27,-0.87
3D body "PRECI-DIP_350-10-103-00-001101.stp": height 7.96, standoff -4.16, extent -1.27,-1.27 6.35,1.27

## PRECI-DIP_350-V3-104-00-001101 [mm] "Pitch 2.54mm, Single Row, Straight 4 Contacts PCB Header"
height 7.96
pads (4):
  round 1.6 hole 0.9: 1(0,0) 2(2.54,0) 3(5.08,0) 4(7.62,0)
Top Overlay:
  circle w0.3: c0,-1.9 r0.15
  lines w0.2: -1.15,-1.127 -1.27,-0.87 -1.27,0.87 -1.15,1.127 ; -1.139,-1.15 -1.083,-1.27 0.883,-1.27 0.939,-1.15 ; -1.139,1.15 -1.083,1.27 0.883,1.27 0.939,1.15 ; 1.15,-0.87 1.47,-0.87 1.657,-1.27 3.423,-1.27 3.61,-0.87 4.01,-0.87 4.197,-1.27 5.963,-1.27 6.15,-0.87 6.55,-0.87 6.737,-1.27 8.703,-1.27 8.89,-0.87 8.89,0.87 8.703,1.27 6.737,1.27 6.55,0.87 6.15,0.87 5.963,1.27 4.197,1.27 4.01,0.87 3.61,0.87 3.423,1.27 1.657,1.27 1.47,0.87 1.15,0.87
Mechanical 8:
  circle w0.05: c0,0 r0.45
  circle w0.05: c0,0 r0.8
  circle w0.05: c2.54,0 r0.45
  circle w0.05: c2.54,0 r0.8
  circle w0.05: c7.62,0 r0.8
  circle w0.05: c7.62,0 r0.45
  circle w0.05: c5.08,0 r0.8
  circle w0.05: c5.08,0 r0.45
  lines w0.05: -0.5,0 0,0 ; 0,-0.5 0,0 ; 0,0.5 0,0 ; 0.5,0 0,0 ; 2.04,0 2.54,0 ; 2.54,-0.5 2.54,0 ; 2.54,0.5 2.54,0 ; 3.04,0 2.54,0 ; 4.58,0 5.08,0 ; 5.08,-0.5 5.08,0 ; 5.08,0.5 5.08,0 ; 5.58,0 5.08,0 ; 7.12,0 7.62,0 ; 7.62,-0.5 7.62,0 ; 7.62,0.5 7.62,0 ; 8.12,0 7.62,0
Mechanical 14:
  circle w0.1: c0,0 r0.9
  circle w0.1: c0,0 r0.7
  circle w0.1: c0,0 r0.4
  circle w0.1: c0,0 r0.25
  circle w0.1: c2.54,0 r0.9
  circle w0.1: c2.54,0 r0.7
  circle w0.1: c2.54,0 r0.4
  circle w0.1: c2.54,0 r0.25
  circle w0.1: c7.62,0 r0.25
  circle w0.1: c7.62,0 r0.4
  circle w0.1: c7.62,0 r0.7
  circle w0.1: c7.62,0 r0.9
  circle w0.1: c5.08,0 r0.25
  circle w0.1: c5.08,0 r0.4
  circle w0.1: c5.08,0 r0.7
  circle w0.1: c5.08,0 r0.9
  lines w0.1: -1.27,-0.87 -1.083,-1.27 0.883,-1.27 1.07,-0.87 1.47,-0.87 1.657,-1.27 3.423,-1.27 3.61,-0.87 4.01,-0.87 4.197,-1.27 5.963,-1.27 6.15,-0.87 6.55,-0.87 6.737,-1.27 8.703,-1.27 8.89,-0.87 8.89,0.87 8.703,1.27 6.737,1.27 6.55,0.87 6.15,0.87 5.963,1.27 4.197,1.27 4.01,0.87 3.61,0.87 3.423,1.27 1.657,1.27 1.47,0.87 1.07,0.87 0.883,1.27 -1.083,1.27 -1.27,0.87 -1.27,-0.87
3D body "PRECI-DIP_350-V3-104-00-001101.stp": height 7.96, standoff -4.16, extent -1.27,-1.27 8.89,1.27

## PRECI-DIP_851-87-050-20-001101 [mm] "Pitch 1.27mm, Single Row, Right Angle, 50 Contacts PCB Socket"
height 2.2
pads (50):
  round 1 hole 0.6: 1(-31.115,0) 2(-29.845,0) 3(-28.575,0) 4(-27.305,0) 5(-26.035,0) 6(-24.765,0) 7(-23.495,0) 8(-22.225,0) 9(-20.955,0) 10(-19.685,0) 11(-18.415,0) 12(-17.145,0) 13(-15.875,0) 14(-14.605,0) 15(-13.335,0) 16(-12.065,0) 17(-10.795,0) 18(-9.525,0) 19(-8.255,0) 20(-6.985,0) 21(-5.715,0) 22(-4.445,0) 23(-3.175,0) 24(-1.905,0) 25(-0.635,0) 26(0.635,0) 27(1.905,0) 28(3.175,0) 29(4.445,0) 30(5.715,0) 31(6.985,0) 32(8.255,0) 33(9.525,0) 34(10.795,0) 35(12.065,0) 36(13.335,0) 37(14.605,0) 38(15.875,0) 39(17.145,0) 40(18.415,0) 41(19.685,0) 42(20.955,0) 43(22.225,0) 44(23.495,0) 45(24.765,0) 46(26.035,0) 47(27.305,0) 48(28.575,0) 49(29.845,0) 50(31.115,0)
Top Overlay:
  circle w0.3: c-31.115,-1.27 r0.15
  lines w0.2: -31.955,1.2 31.955,1.2 31.955,5.3 -31.955,5.3 -31.955,1.2
  text "50" at 29.7,1.6 h1.2
Mechanical 8:
  drawing of 202 lines, arcs and shapes, not listed
Mechanical 14:
  drawing of 154 lines, arcs and shapes, not listed
  text "50" at 29.7,1.6 h1.2
3D body "PRECI-DIP_851-87-050-20-001101.stp": height 2.2, standoff -3.6, extent -31.955,-0.22 31.955,5.3

## PRECI-DIP_852-10-050-20-001 [mm] "50 Contacts, Ultraminiature PCB Pin Connector 1.27mm, Double Row, Solder Tail, Right Angle"
height 3.25
pads (50):
  round 1 hole 0.6: 1(-15.24,-0.635) 2(-15.24,0.635) 3(-13.97,-0.635) 4(-13.97,0.635) 5(-12.7,-0.635) 6(-12.7,0.635) 7(-11.43,-0.635) 8(-11.43,0.635) 9(-10.16,-0.635) 10(-10.16,0.635) 11(-8.89,-0.635) 12(-8.89,0.635) 13(-7.62,-0.635) 14(-7.62,0.635) 15(-6.35,-0.635) 16(-6.35,0.635) 17(-5.08,-0.635) 18(-5.08,0.635) 19(-3.81,-0.635) 20(-3.81,0.635) 21(-2.54,-0.635) 22(-2.54,0.635) 23(-1.27,-0.635) 24(-1.27,0.635) 25(0,-0.635) 26(0,0.635) 27(1.27,-0.635) 28(1.27,0.635) 29(2.54,-0.635) 30(2.54,0.635) 31(3.81,-0.635) 32(3.81,0.635) 33(5.08,-0.635) 34(5.08,0.635) 35(6.35,-0.635) 36(6.35,0.635) 37(7.62,-0.635) 38(7.62,0.635) 39(8.89,-0.635) 40(8.89,0.635) 41(10.16,-0.635) 42(10.16,0.635) 43(11.43,-0.635) 44(11.43,0.635) 45(12.7,-0.635) 46(12.7,0.635) 47(13.97,-0.635) 48(13.97,0.635) 49(15.24,-0.635) 50(15.24,0.635)
Top Overlay:
  drawing of 155 lines, arcs and shapes, not listed
  text "50" at 17.4,-0.2 h1.2
Mechanical 8:
  lines w0.1: 0,1 0,0 1,0
Mechanical 14:
  drawing of 229 lines, arcs and shapes, not listed
3D body "PRECI-DIP_852-10-050-20-001.stp": height 3.25, standoff -3.2, extent -16.08,-0.84 16.08,6.735

## QA_50-PRP2509S [mm] "Probe For 1.27mm Pitch, Serrated Head"
height 20
pads (1):
  round 0.5 hole 1 unplated mask+0.25: H1(0,0)
Mechanical 8:
  lines w0.05: -0.5,0 0,0 ; 0,-0.5 0,0 ; 0,0.5 0,0 ; 0.5,0 0,0
Mechanical 14:
  lines w0.1: -0.665,-0.035 0.035,0.665 ; -0.629,-0.071 0.071,0.629 ; -0.594,-0.106 0.106,0.594 ; -0.559,-0.141 0.141,0.559 ; -0.523,-0.177 0.177,0.523 ; -0.488,-0.212 0.212,0.488 ; -0.453,-0.247 0.247,0.453 ; -0.417,-0.283 0.283,0.417 ; -0.382,-0.318 0.318,0.382 ; -0.346,-0.354 0.354,0.346 ; -0.311,-0.389 0.389,0.311 ; -0.276,-0.424 0.424,0.276 ; -0.24,-0.46 0.46,0.24 ; -0.205,-0.495 0.495,0.205 ; -0.17,-0.53 0.53,0.17 ; -0.134,-0.566 0.566,0.134 ; -0.099,-0.601 0.601,0.099 ; -0.064,-0.636 0.636,0.064 ; -0.028,-0.672 0.672,0.028 ; -0.7,0 0,0.7 0.7,0 0,-0.7 -0.7,0
Mechanical 15:
  circle w0.05: c0,0 r0.635
Mechanical 16:
  circle w0.05: c0,0 r0.635
3D body "QA_50-PRP2509S.stp": height 14.93, standoff -36.07, extent -0.521,-0.521 0.521,0.521

## QA_50-PRP2541S [mm] "Probe For 1.27mm Pitch, Spear Head"
height 20
pads (1):
  round 0.5 hole 1 unplated mask+0.25: H1(0,0)
Mechanical 8:
  lines w0.05: -0.5,0 0,0 ; 0,-0.5 0,0 ; 0,0.5 0,0 ; 0.5,0 0,0
Mechanical 14:
  circle w0.2: c0,0 r0.1
  lines w0.1: -0.7,0 0,-0.7 0.7,0 0,0.7 -0.7,0
Mechanical 15:
  circle w0.05: c0,0 r0.635
Mechanical 16:
  circle w0.05: c0,0 r0.635
3D body "QA_50-PRP2541S.stp": height 14.93, standoff -36.07, extent -0.521,-0.521 0.521,0.521

## QA_50-PRP2558S [mm] "Probe For 1.27mm Pitch, Crown Head"
height 20
pads (1):
  round 0.5 hole 1 unplated mask+0.25: H1(0,0)
Mechanical 8:
  lines w0.05: -0.5,0 0,0 ; 0,-0.5 0,0 ; 0,0.5 0,0 ; 0.5,0 0,0
Mechanical 14:
  lines w0.1: -0.25,0 0.25,0 ; 0,-0.25 0,0.25 ; -0.7,0 0,0.7 0.7,0 0,-0.7 -0.7,0
Mechanical 15:
  circle w0.05: c0,0 r0.635
Mechanical 16:
  circle w0.05: c0,0 r0.635
3D body "QA_50-PRP2558S.stp": height 14.93, standoff -36.07, extent -0.521,-0.521 0.521,0.521

## QA_75-PRP2507S [mm] "Probe For 1.905mm Pitch, Torch Head"
height 20
pads (1):
  round 0.5 hole 1.35 unplated mask+0.425: H1(0,0)
Mechanical 8:
  lines w0.05: -0.5,0 0,0 ; 0,-0.5 0,0 ; 0,0.5 0,0 ; 0.5,0 0,0
Mechanical 14:
  lines w0.1: -0.375,-0.375 0.375,0.375 ; -0.375,0.375 0.375,-0.375 ; -0.7,-0.7 0.7,-0.7 0.7,0.7 -0.7,0.7 -0.7,-0.7
Mechanical 15:
  circle w0.05: c0,0 r0.9
Mechanical 16:
  circle w0.05: c0,0 r0.9
3D body "QA_75-PRP2507S.stp": height 14.78, standoff -31.67, extent -0.74,-0.74 0.741,0.741

## QA_75-PRP2509S [mm] "Probe For 1.905mm Pitch, Serrated Head"
height 20
pads (1):
  round 0.5 hole 1.35 unplated mask+0.425: H1(0,0)
Mechanical 8:
  lines w0.05: -0.5,0 0,0 ; 0,-0.5 0,0 ; 0,0.5 0,0 ; 0.5,0 0,0
Mechanical 14:
  lines w0.1: -0.7,-0.65 0.7,-0.65 ; -0.7,-0.6 0.7,-0.6 ; -0.7,-0.55 0.7,-0.55 ; -0.7,-0.5 0.7,-0.5 ; -0.7,-0.45 0.7,-0.45 ; -0.7,-0.4 0.7,-0.4 ; -0.7,-0.35 0.7,-0.35 ; -0.7,-0.3 0.7,-0.3 ; -0.7,-0.25 0.7,-0.25 ; -0.7,-0.2 0.7,-0.2 ; -0.7,-0.15 0.7,-0.15 ; -0.7,-0.1 0.7,-0.1 ; -0.7,-0.05 0.7,-0.05 ; -0.7,0 0.7,0 ; -0.7,0.05 0.7,0.05 ; -0.7,0.1 0.7,0.1 ; -0.7,0.15 0.7,0.15 ; -0.7,0.2 0.7,0.2 ; -0.7,0.25 0.7,0.25 ; -0.7,0.3 0.7,0.3 ; -0.7,0.35 0.7,0.35 ; -0.7,0.4 0.7,0.4 ; -0.7,0.45 0.7,0.45 ; -0.7,0.5 0.7,0.5 ; -0.7,0.55 0.7,0.55 ; -0.7,0.6 0.7,0.6 ; -0.7,0.65 0.7,0.65 ; -0.7,-0.7 0.7,-0.7 0.7,0.7 -0.7,0.7 -0.7,-0.7
Mechanical 15:
  circle w0.05: c0,0 r0.9
Mechanical 16:
  circle w0.05: c0,0 r0.9
3D body "QA_75-PRP2509S.stp": height 14.78, standoff -31.67, extent -0.74,-0.74 0.741,0.741

## QA_75-PRP2541S [mm] "Probe For 1.905mm Pitch, Spear Head"
height 20
pads (1):
  round 0.5 hole 1.35 unplated mask+0.425: H1(0,0)
Mechanical 8:
  lines w0.05: -0.5,0 0,0 ; 0,-0.5 0,0 ; 0,0.5 0,0 ; 0.5,0 0,0
Mechanical 14:
  circle w0.2: c0,0 r0.1
  lines w0.1: -0.7,-0.7 0.7,-0.7 0.7,0.7 -0.7,0.7 -0.7,-0.7
Mechanical 15:
  circle w0.05: c0,0 r0.9
Mechanical 16:
  circle w0.05: c0,0 r0.9
3D body "QA_75-PRP2541S.stp": height 14.78, standoff -31.67, extent -0.74,-0.74 0.741,0.741